# Altium footprint library laihi.PcbLib: 222 footprints (part 12 of 14)
Each footprint in its own frame and in the unit in brackets; x right, y up, seen from the top. Pads: shape width x height; smd on the part's side, far side on the other; paste and mask are expansions set on the pad; w line width, h text height; cw(c..) or ccw(c..) is an arc to the next point about the centre after c.
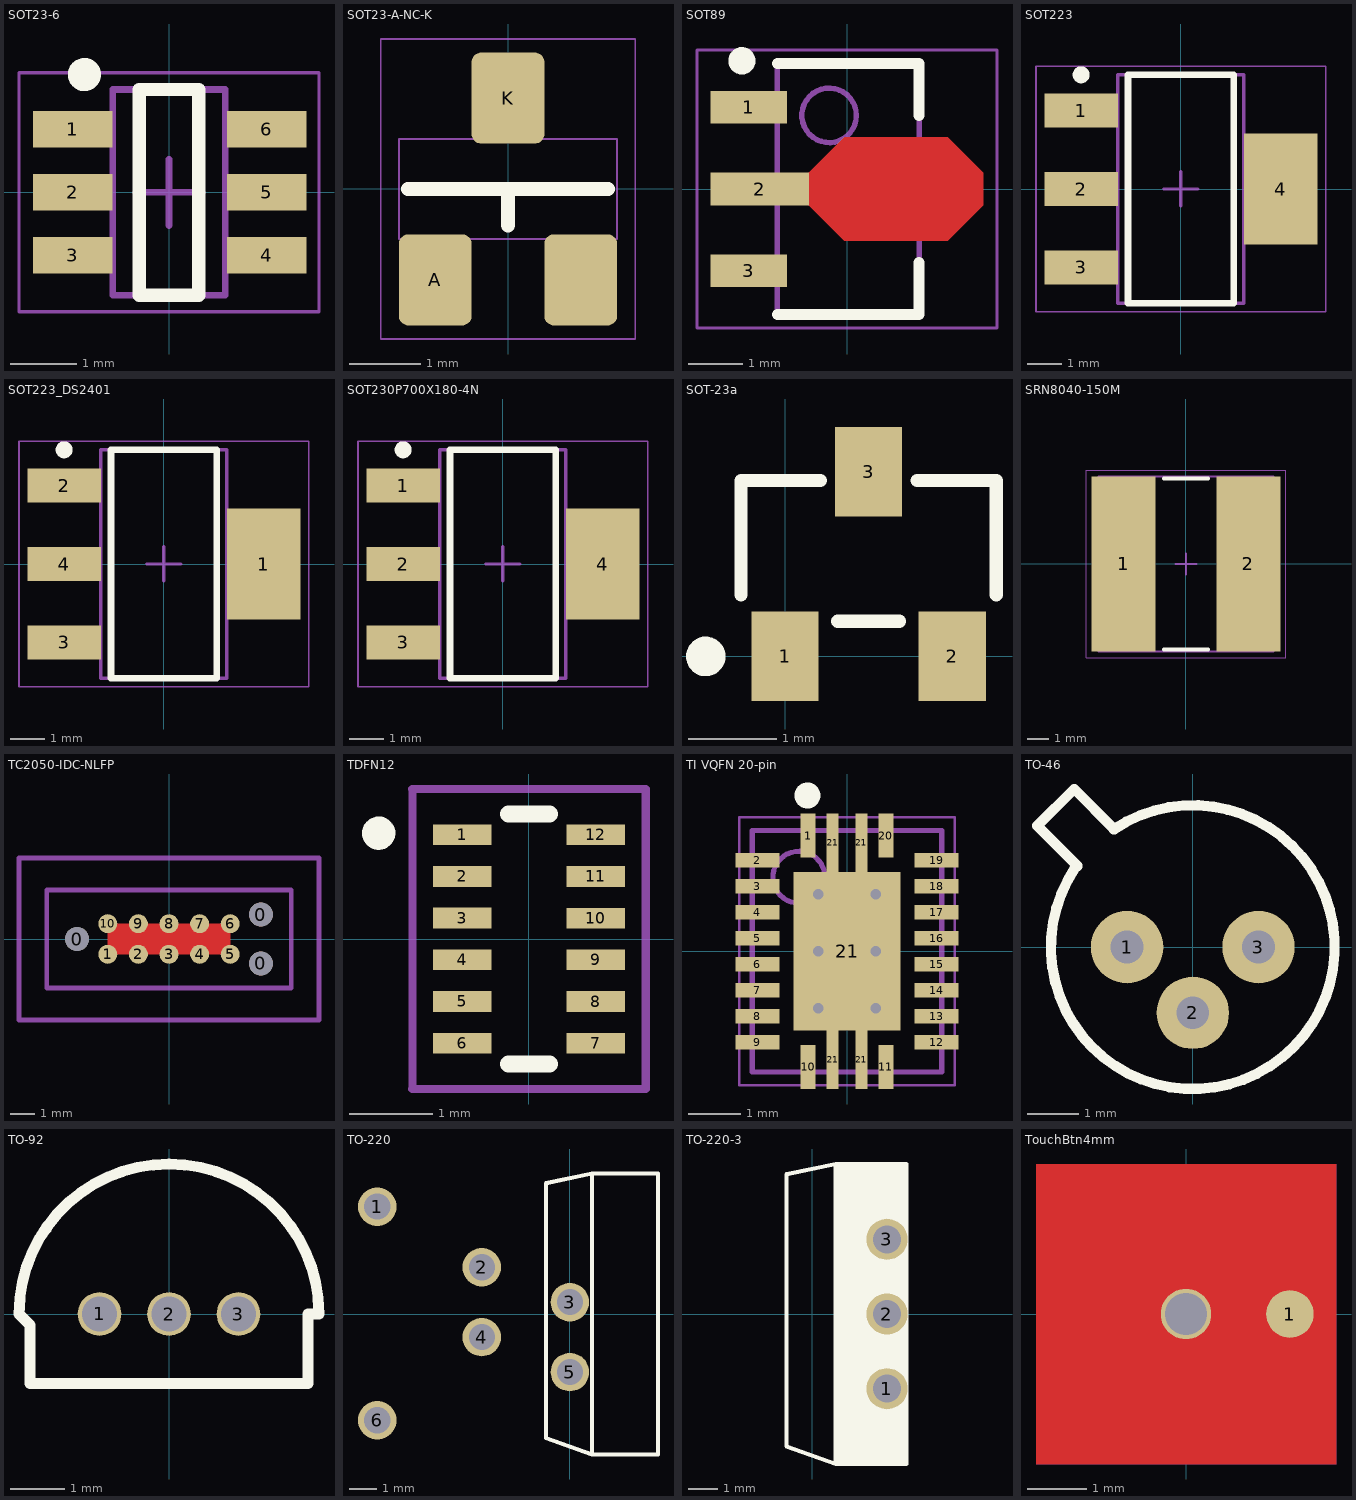
[diagram p11: the footprints below, top view; thin cyan lines are the x and y axes]

## SOT23-6 [mm] "TSOP, 6-Leads, Body 2.90x1.60mm, Pitch 0.95mm, IPC Medium Density"
height 1.1
pads (6):
  rect 1.2x0.55 smd: 1(-1.448,0.95) 2(-1.448,0) 3(-1.448,-0.95) 4(1.473,-0.95) 5(1.473,0) 6(1.473,0.95)
Top Overlay:
  circle w0.25: c-1.275,1.775 r0.125
  lines w0.2: -0.45,-1.55 0.45,-1.55 0.45,1.55 -0.45,1.55 -0.45,-1.55
Mechanical 13:
  lines w0.1: -0.85,-1.55 0.85,-1.55 0.85,1.55 -0.85,1.55 -0.85,-1.55
Mechanical 15:
  lines w0.05: -2.261,-1.8 2.261,-1.8 2.261,1.8 -2.261,1.8 -2.261,-1.8
  lines w0.1: -0.5,0 0.5,0 ; 0,-0.5 0,0.5
3D body: height 1.1, standoff 0.1, extent -0.85,-1.55 0.85,1.55

## SOT23-A-NC-K [mil] "STX"
pads (3):
  rrect25% 40x50 smd: A(-40,-50) K(0,50) ""(40,-50)
Top Overlay:
  lines w7.87: -55,0 55,0 ; 0,-20 0,0
Mechanical 13:
  lines w1: -50,-27.5 -50,-52.5 -30,-52.5 -30,-27.5 ; -10,27.5 -10,47.5 10,47.5 10,27.5 ; 30,-27.5 30,-52.5 50,-52.5 50,-27.5 ; -60,-27.5 60,-27.5 60,27.5 -60,27.5 -60,-27.5
Mechanical 15:
  lines w0.98: -70,82.48 70,82.48 70,-82.48
  lines w1: -70,82.28 -70,-82.5 70,-82.5
3D body "sot23-3.stp": height 40.16, standoff -3.94, extent -59.84,-51.96 59.84,51.97

## SOT89 [mm] "SOT89, 3-Leads, Body 4.50x2.45mm, Pitch 1.50mm, Lead Span 3.9mm, IPC Medium Density"
height 1.6
pads (3):
  rect 1.4x0.6 smd: 1(-1.8,1.5) 3(-1.8,-1.5)
  rect 1.8x0.6 smd: 2(-1.6,0)
Top Layer:
  region: -0.7,0.3 -0.05,0.95 1.85,0.95 2.5,0.3 2.5,-0.3 1.85,-0.95 -0.05,-0.95 -0.7,-0.3
Top Overlay:
  circle w0.25: c-1.927,2.35 r0.125
  lines w0.2: -1.278,-2.3 1.322,-2.3 1.322,-1.35 ; -1.278,2.3 1.322,2.3 1.322,1.35
Mechanical 13:
  circle w0.1: c-0.327,1.35 r0.5
  lines w0.1: -1.278,-2.3 1.322,-2.3 1.322,2.3 -1.278,2.3 -1.278,-2.3
Mechanical 15:
  lines w0.05: -2.75,-2.55 2.75,-2.55 2.75,2.55 -2.75,2.55 -2.75,-2.55
  lines w0.1: -0.477,0 0.523,0 ; 0.022,-0.5 0.022,0.5
3D body "SOT89.step": height 1.6, standoff 0, extent -2.2,-2.3 1.85,2.3

## SOT223 [mm] "SOT223, 4-Leads, Body 6.50x7.00mm (avg), Pitch 2.30mm, IPC Medium Density"
height 1.8
pads (4):
  rect 2.15x1 smd: 1(-2.925,2.3) 2(-2.925,0) 3(-2.925,-2.3)
  rect 2.15x3.25 smd: 4(2.925,0)
Top Overlay:
  circle w0.25: c-2.925,3.35 r0.125
  lines w0.2: -1.55,-3.35 1.55,-3.35 1.55,3.35 -1.55,3.35 -1.55,-3.35
Mechanical 13:
  lines w0.1: -1.85,-3.35 1.85,-3.35 1.85,3.35 -1.85,3.35 -1.85,-3.35
Mechanical 15:
  lines w0.05: -4.25,-3.6 4.25,-3.6 4.25,3.6 -4.25,3.6 -4.25,-3.6
  lines w0.1: -0.5,0 0.5,0 ; 0,-0.5 0,0.5
3D body: height 1.8, standoff 0.06, extent -1.85,-3.35 1.85,3.35

## SOT223_DS2401 [mm] "SOT223, 4-Leads, Body 6.50x7.00mm (avg), Pitch 2.30mm, IPC Medium Density"
height 1.8
pads (4):
  rect 2.15x3.25 smd: 1(2.925,0)
  rect 2.15x1 smd: 2(-2.925,2.3) 3(-2.925,-2.3) 4(-2.925,0)
Top Overlay:
  circle w0.25: c-2.925,3.35 r0.125
  lines w0.2: -1.55,-3.35 -1.55,3.35 1.55,3.35 1.55,-3.35 -1.55,-3.35
Mechanical 13:
  lines w0.1: -1.85,-3.35 -1.85,3.35 1.85,3.35 1.85,-3.35 -1.85,-3.35
Mechanical 15:
  lines w0.05: -4.25,-3.6 -4.25,3.6 4.25,3.6 4.25,-3.6 -4.25,-3.6
  lines w0.1: -0.5,0 0.5,0 ; 0,-0.5 0,0.5
3D body: height 1.8, standoff 0.06, extent -1.85,-3.35 1.85,3.35

## SOT230P700X180-4N [mm] "SOT223, 4-Leads, Body 6.50x7.00mm (avg), Pitch 2.30mm, IPC Medium Density"
height 1.8
pads (4):
  rect 2.15x1 smd: 1(-2.925,2.3) 2(-2.925,0) 3(-2.925,-2.3)
  rect 2.15x3.25 smd: 4(2.925,0)
Top Overlay:
  circle w0.25: c-2.925,3.35 r0.125
  lines w0.2: -1.55,-3.35 -1.55,3.35 1.55,3.35 1.55,-3.35 -1.55,-3.35
Mechanical 13:
  lines w0.1: -1.85,-3.35 -1.85,3.35 1.85,3.35 1.85,-3.35 -1.85,-3.35
Mechanical 15:
  lines w0.05: -4.25,-3.6 -4.25,3.6 4.25,3.6 4.25,-3.6 -4.25,-3.6
  lines w0.1: -0.5,0 0.5,0 ; 0,-0.5 0,0.5
3D body: height 1.8, standoff 0.02, extent -1.85,-3.35 1.85,3.35

## SOT-23a [mil]
pads (3):
  rect 30x40 smd: 1(0,0) 2(74.8,0) 3(37.4,82.68)
Top Overlay:
  circle w9.84: c-35.43,0 r3.94
  lines w5.91: -19.68,27.56 -19.68,78.74 15.75,78.74 ; 23.62,15.75 51.18,15.75 ; 59.06,78.74 94.49,78.74 94.49,27.56
3D body "User Library-sot23-1.step": height 39.37, standoff 0, extent -20.07,-4.72 94.89,87.4

## SRN8040-150M [mm] "SRN8040 Series - Semi-shielded Power Inductors"
height 4
pads (2):
  rect 3.06x8.32 smd: 1(-2.97,0) 2(2.97,0)
Top Overlay:
  lines w0.2: -1.05,-4.06 1.05,-4.06 ; -1.05,4.06 1.05,4.06
Mechanical 13:
  lines w0.1: -4.15,-4.15 -4.15,4.15 4.15,4.15 4.15,-4.15 -4.15,-4.15
Mechanical 15:
  lines w0.05: -4.75,-4.45 -4.75,4.45 4.75,4.45 4.75,-4.45 -4.75,-4.45
  lines w0.1: -0.5,0 0.5,0 ; 0,-0.5 0,0.5
3D body: height 4, standoff 0, extent -1.75,-4.15 1.75,4.15
3D body: height 4, standoff 0, extent -4.15,-4.15 -1.75,4.15
3D body: height 4, standoff 0, extent 1.75,-4.15 4.15,4.15

## TC2050-IDC-NLFP [mil]
pads (13):
  round 39 hole 39 unplated: 0(-150,0) 0(150,-40) 0(150,40)
  round 31 smd paste-196.85: 1(-100,-25) 2(-50,-25) 3(0,-25) 4(50,-25) 5(100,-25) 6(100,25) 7(50,25) 8(0,25) 9(-50,25) 10(-100,25)
Top Layer:
  pour cut-out: -100,25 -100,-25 100,-25 100,25
Mechanical 15:
  lines w7.87: -245,-132.5 -245,132.5 245,132.5 245,-132.5 -245,-132.5 ; -199.8,-79.92 -199.8,79.92 199.8,79.92 199.8,-79.92 -199.8,-79.92

## TDFN12 [mm] "TDFN12(2X3mm)"
height 0.75
pads (12):
  rect 0.7x0.25 smd: 1(-0.8,1.25) 2(-0.8,0.75) 3(-0.8,0.25) 4(-0.8,-0.25) 5(-0.8,-0.75) 6(-0.8,-1.25) 7(0.8,-1.25) 8(0.8,-0.75) 9(0.8,-0.25) 10(0.8,0.25) 11(0.8,0.75) 12(0.8,1.25)
Top Overlay:
  lines w0.2: -1.879,1.335 ccw(c-1.803,1.27) -1.863,1.35 ; -0.25,-1.5 0.25,-1.5 ; -0.25,1.5 0.25,1.5
Mechanical 15:
  lines w0.1: -1.4,-1.8 1.4,-1.8 1.4,1.8 -1.4,1.8 ; -1.397,-1.8 -1.397,1.8
3D body: height 0.75, standoff 0, extent -0.914,-1.549 0.889,1.524

## TI VQFN 20-pin [mm] "PQFN, 20-Leads, Body 3.50x4.50mm, Pitch 0.50mm, Thermal Pad 2.05x3.05mm, IPC Medium Density"
height 1
pads (25):
  rect 0.28x0.85 smd: 1(-0.75,2.225) 10(-0.75,-2.225) 11(0.75,-2.225) 20(0.75,2.225)
  rect 0.85x0.28 smd: 2(-1.725,1.75) 3(-1.725,1.25) 4(-1.725,0.75) 5(-1.725,0.25) 6(-1.725,-0.25) 7(-1.725,-0.75) 8(-1.725,-1.25) 9(-1.725,-1.75) 12(1.725,-1.75) 13(1.725,-1.25) 14(1.725,-0.75) 15(1.725,-0.25) 16(1.725,0.25) 17(1.725,0.75) 18(1.725,1.25) 19(1.725,1.75)
  rect 0.23x1.125 smd: 21(-0.275,-2.088) 21(-0.275,2.088) 21(0.275,-2.088) 21(0.275,2.088)
  rect 2.05x3.05 smd: 21(0,0)
via -0.55,1.1 diameter 0.5 hole 0.2
via 0.55,1.1 diameter 0.5 hole 0.2
via -0.55,0 diameter 0.5 hole 0.2
via 0.55,0 diameter 0.5 hole 0.2
via -0.55,-1.1 diameter 0.5 hole 0.2
via 0.55,-1.1 diameter 0.5 hole 0.2
Top Overlay:
  circle w0.25: c-0.762,2.997 r0.125
Mechanical 13:
  circle w0.1: c-0.925,1.425 r0.5
  lines w0.1: -1.825,-2.325 -1.825,2.325 1.825,2.325 1.825,-2.325 -1.825,-2.325
Mechanical 15:
  lines w0.05: -2.075,-2.575 -2.075,2.575 2.075,2.575 2.075,-2.575 -2.075,-2.575
  lines w0.1: -0.5,0 0.5,0 ; 0,-0.5 0,0.5
3D body: height 1, standoff 0.05, extent -1.825,-2.325 1.825,2.325

## TO-46 [mm] "Metal Can; 3 Leads; Can Circle Dia. 5.6 mm; Lead Dia. 0.483 mm (max)"
height 2.667
pads (3):
  round 1.4 hole 0.635: 1(-1.27,0) 2(0,-1.27) 3(1.27,0)
Top Overlay:
  lines w0.2: -2.274,1.534 ccw(c0,0) -1.534,2.274 ; -2.235,1.562 -2.235,1.575 -3.006,2.346 -2.295,3.057 -1.517,2.279

## TO-92 [mm] "Metal Can; 3 Leads; Can Circle Dia. 5.6 mm; Lead Dia. 0.483 mm (max)"
height 7
pads (3):
  round 0.8 hole 0.635: 1(-1.27,0) 2(0,0) 3(1.27,0)
Top Overlay:
  lines w0.2: -2.235,1.562 -2.235,1.575 ; -2.743,0 cw(c0,0) 2.743,0 2.54,0 2.54,-1.27 -2.54,-1.27 -2.54,-0.203 -2.743,0

## TO-220 [mm] "6-Lead FairChild Power Series"
height 16
pads (6):
  round 1.4 hole 0.95 mask+0.15: 1(-7,3.9) 2(-3.2,1.7) 3(0,0.43) 4(-3.2,-0.84) 5(0,-2.11) 6(-7,-3.86)
Top Overlay:
  lines w0.15: 0.8,-5.1 0.8,5.1 ; 0.8,-5.1 3.2,-5.1 3.2,5.1 0.8,5.1 ; 0.8,-5.1 -0.875,-4.5 -0.875,4.75 0.8,5.1

## TO-220-3 [mm] "3-Lead FairChild Power Series"
height 16
pads (3):
  round 1.4 hole 0.95 mask+0.15: 1(2.54,-2.54) 2(2.54,0) 3(2.54,2.54)
Top Overlay:
  region: 0.8,-5.1 3.2,-5.1 3.2,5.1 0.8,5.1
  lines w0.15: 0.8,-5.1 -0.875,-4.5 -0.875,4.75 0.8,5.1 ; 0.8,-5.1 3.2,-5.1 3.2,5.1 0.8,5.1 ; 0.8,-5.1 0.8,5.1

## TouchBtn4mm [mm] "Touch button 4mm diameter"
pads (2):
  round 0.8 smd: 1(1.75,0)
  round 0.85 hole 0.7: ""(0,0)
Top Layer:
  circle w1: c0,0 r1.75
  pour cut-out: -2.525,2.525 2.525,2.525 2.525,-2.525 -2.525,-2.525
Bottom Layer:
  pour cut-out: -2.525,2.525 2.525,2.525 2.525,-2.525 -2.525,-2.525
Top Solder:
  circle w1.15: c0,0 r1.75